# Altium footprint library DevKit - PCB.PcbLib: 30 footprints (part 2 of 2)
Each footprint in its own frame and in the unit in brackets; x right, y up, seen from the top. Pads: shape width x height; smd on the part's side, far side on the other; paste and mask are expansions set on the pad; w line width, h text height; cw(c..) or ccw(c..) is an arc to the next point about the centre after c.
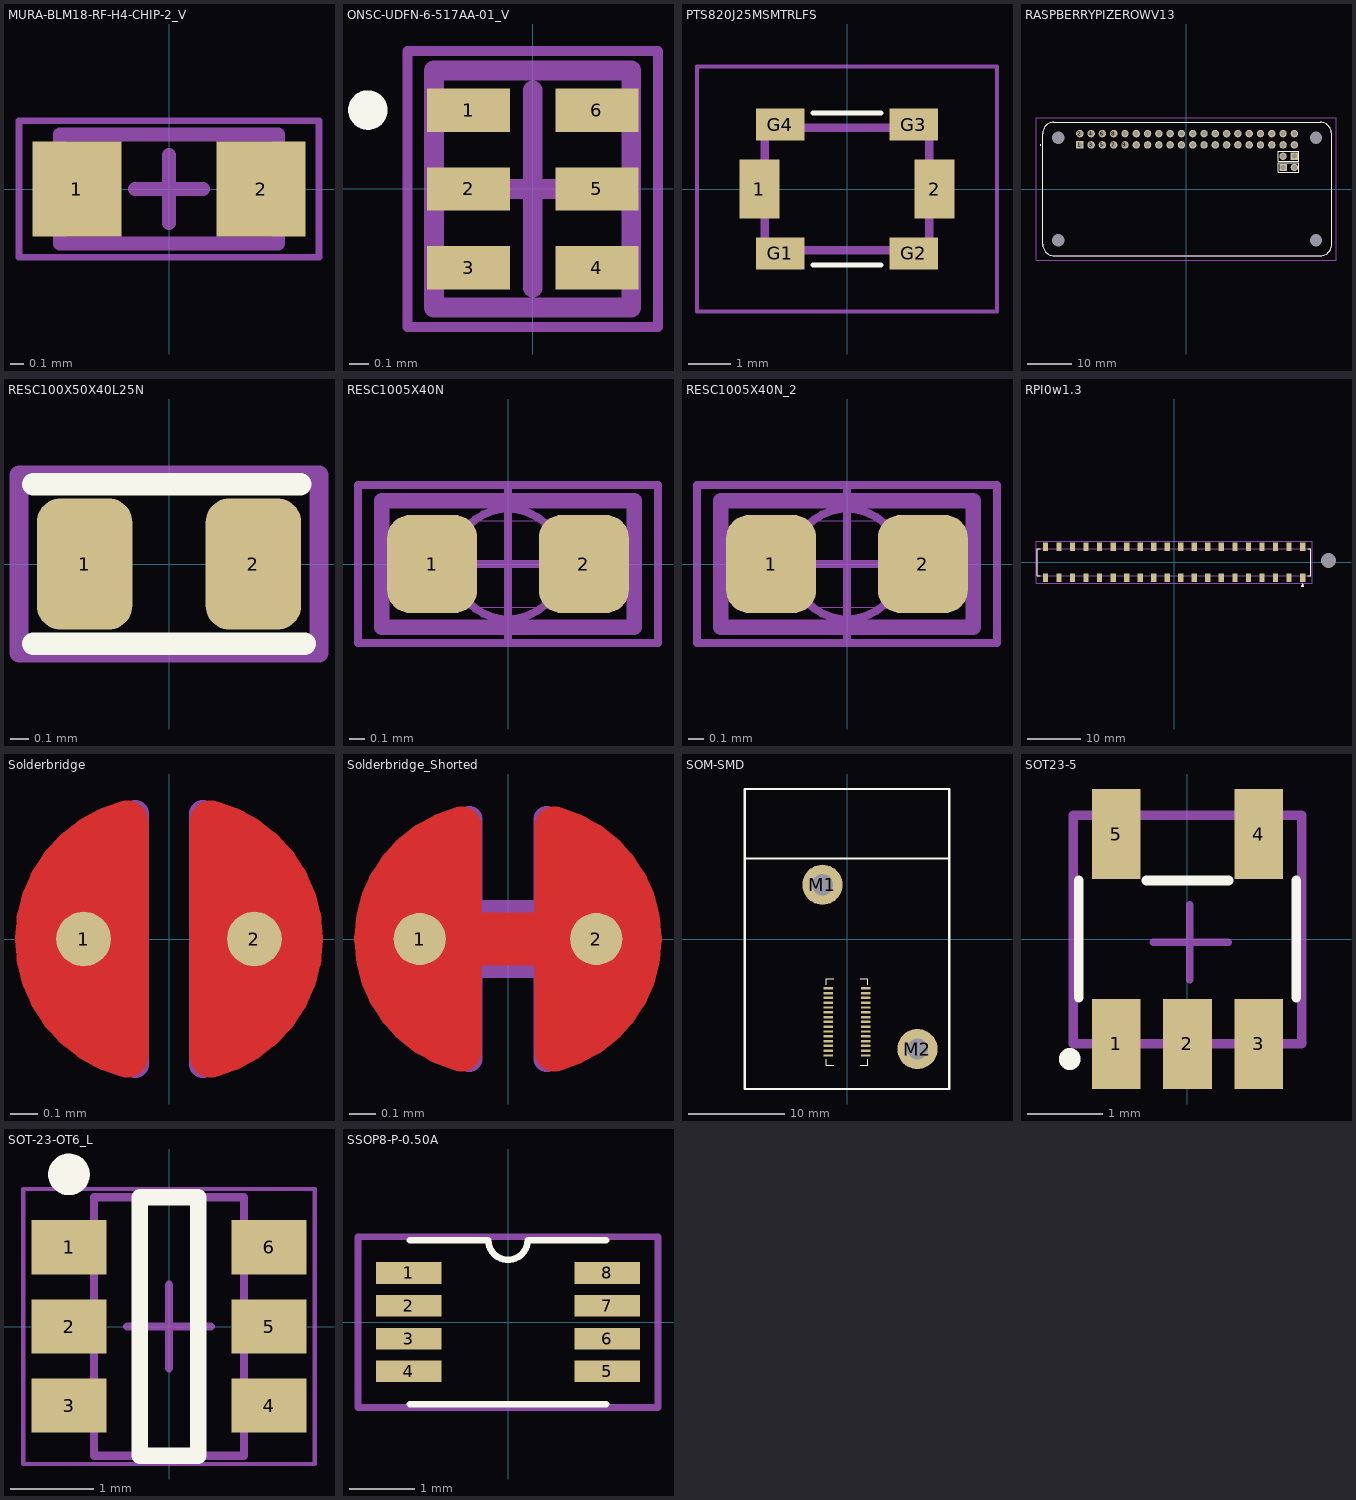
[diagram p1: the footprints below, top view; thin cyan lines are the x and y axes]

## MURA-BLM18-RF-H4-CHIP-2_V [mm]
pads (2):
  rect 0.65x0.7 smd: 1(-0.675,0) 2(0.675,0)
Mechanical 6:
  text "Land Pattern Adapted for Reflow Soldering" at -1,0.6 h0.05
Mechanical 15:
  lines w0.05: -1.1,-0.5 -1.1,0.5 1.1,0.5 1.1,-0.5 -1.1,-0.5
  lines w0.1: -0.25,0 0.25,0 ; 0,-0.25 0,0.25
Mechanical 16:
  lines w0.1: -0.8,-0.4 0.8,-0.4 0.8,0.4 -0.8,0.4 -0.8,-0.4
  text ".Designator" at 0.937,-0.432 h1.5
3D body "BLM18HE152SN1D.STEP": height 0.95, standoff 0, extent -0.8,-0.4 0.8,0.4

## ONSC-UDFN-6-517AA-01_V [mm]
pads (6):
  rect 0.42x0.22 smd mask+0.051: 1(-0.325,0.4) 2(-0.325,0) 3(-0.325,-0.4) 4(0.325,-0.4) 5(0.325,0) 6(0.325,0.4)
Top Overlay:
  circle w0.1: c-0.835,0.4 r0.05
Mechanical 13:
  lines w0.1: -0.5,-0.6 -0.5,0.6 0.5,0.6 0.5,-0.6 -0.5,-0.6
Mechanical 15:
  lines w0.05: -0.635,-0.7 -0.635,0.7 0.635,0.7 0.635,-0.7 -0.635,-0.7
  lines w0.1: -0.5,0 0.5,0 ; 0,-0.5 0,0.5
3D body: height 0.55, standoff 0, extent -0.5,-0.6 0.5,0.6

## PTS820J25MSMTRLFS [mm]
pads (6):
  rect 0.95x1.4 smd: 1(-2.075,0) 2(2.075,0)
  rect 1.15x0.75 smd: G1(-1.575,-1.525) G2(1.575,-1.525) G3(1.575,1.525) G4(-1.575,1.525)
Top Overlay:
  lines w0.127: -0.8,-1.8 0.8,-1.8 ; -0.8,1.8 0.8,1.8
Mechanical 15:
  lines w0.1: -3.55,-2.9 3.55,-2.9 3.55,2.9 -3.55,2.9 -3.55,-2.9
Mechanical 16:
  lines w0.2: -1.95,-1.45 -1.95,1.45 1.95,1.45 1.95,-1.45 -1.95,-1.45
  text ".Designator" at -0.889,-0.399 h1.52
3D body "PUSHBUTTON-PTS820 v3.step": height 2.05, standoff 0.05, extent -2.25,-1.45 2.25,1.45

## RASPBERRYPIZEROWV13 [mm]
pads (48):
  rect 1.665x1.665 hole 1.11: 1(-23.885,9.92) 41(24.375,7.38) 43(21.835,4.84)
  round 1.665 hole 1.11: 2(-23.885,12.46) 3(-21.345,9.92) 4(-21.345,12.46) 5(-18.805,9.92) 6(-18.805,12.46) 7(-16.265,9.92) 8(-16.265,12.46) 9(-13.725,9.92) 10(-13.725,12.46) 11(-11.185,9.92) 12(-11.185,12.46) 13(-8.645,9.92) 14(-8.645,12.46) 15(-6.105,9.92) 16(-6.105,12.46) 17(-3.565,9.92) 18(-3.565,12.46) 19(-1.025,9.92) 20(-1.025,12.46) 21(1.515,9.92) 22(1.515,12.46) 23(4.055,9.92) 24(4.055,12.46) 25(6.595,9.92) 26(6.595,12.46) 27(9.135,9.92) 28(9.135,12.46) 29(11.675,9.92) 30(11.675,12.46) 31(14.215,9.92) 32(14.215,12.46) 33(16.755,9.92) 34(16.755,12.46) 35(19.295,9.92) 36(19.295,12.46) 37(21.835,9.92) 38(21.835,12.46) 39(24.375,9.92) 40(24.375,12.46) 42(21.835,7.38) 44(24.375,4.84)
  round 1.4 hole 2.8 unplated: MH1(-28.755,11.5) MH2(-28.755,-11.5) MH3(29.245,-11.5) MH4(29.245,11.5)
Top Overlay:
  lines w0.1: -32.255,12.46 -32.255,-12.46 ccw(c-29.715,-12.46) -29.759,-15 ; -32.255,12.464 cw(c-29.755,12.499) -29.755,15 30.245,15 ; -29.755,-15 30.245,-15 ccw(c30.245,-12.499) 32.745,-12.464 ; 30.249,15 cw(c30.205,12.46) 32.745,12.46 32.745,-12.46 ; -32.695,9.84 ccw(c-32.695,9.89) -32.695,9.94 ccw(c-32.695,9.89) -32.695,9.84 ; 20.805,3.74 25.405,3.74 25.405,5.94 20.805,5.94 20.805,3.74 ; 20.805,6.28 25.405,6.28 25.405,8.48 20.805,8.48 20.805,6.28
Mechanical 16:
  lines w0.2: -32.255,12.46 -32.255,-12.46 ccw(c-29.715,-12.46) -29.759,-15 ; -32.255,12.464 cw(c-29.755,12.499) -29.755,15 30.245,15 ; -29.755,-15 30.245,-15 ccw(c30.245,-12.499) 32.745,-12.464 ; 30.249,15 cw(c30.245,12.499) 32.745,12.46 32.745,-12.46
  text ".Designator" at -0.636,-0.061 h0.8
Mechanical 20:
  lines w0.1: -33.745,-16 33.745,-16 33.745,16 -33.745,16 -33.745,-16
3D body "Raspberry PI Zero W.step": height 9.98, standoff -1.4, extent -32.246,-15.65 32.754,15

## RESC100X50X40L25N [mm]
pads (2):
  rrect50% 0.51x0.7 smd mask+0.05: 1(-0.45,0) 2(0.45,0)
Top Overlay:
  lines w0.12: -0.725,-0.425 0.725,-0.425 ; -0.725,0.425 0.7,0.425
Mechanical 16:
  lines w0.1: -0.8,-0.475 -0.8,0.475 0.8,0.475 0.8,-0.475 -0.8,-0.475
  text ".Designator" at -1.2,0.2 h0.8
3D body "R0402.STEP": height 0.34, standoff 0, extent -0.52,-0.3 0.52,0.3

## RESC1005X40N [mm]
pads (2):
  rrect50% 0.57x0.62 smd: 1(-0.48,0) 2(0.48,0)
Mechanical 4:
  circle w0.05: c0,0 r0.35
  lines w0.05: -0.5,0 0.5,0 ; 0,-0.5 0,0.5 ; -0.95,-0.5 0.95,-0.5 0.95,0.5 -0.95,0.5 -0.95,-0.5
Mechanical 13:
  lines w0.001: -0.525,-0.275 0.525,-0.275 0.525,0.275 -0.525,0.275 -0.525,-0.275
Mechanical 16:
  lines w0.1: -0.8,-0.4 0.8,-0.4 0.8,0.4 -0.8,0.4 -0.8,-0.4
  text ".Designator" at -1.3,-1.3 h1.5
3D body "RES 0402 (1005 metric).STEP": height 0.4, standoff 0, extent -0.525,-0.275 0.525,0.275

## RESC1005X40N_2 [mm]
pads (2):
  rrect50% 0.57x0.62 smd: 1(-0.48,0) 2(0.48,0)
Mechanical 1:
  lines w0.1: -0.8,-0.4 0.8,-0.4 0.8,0.4 -0.8,0.4 -0.8,-0.4
  text ".Designator" at -1.3,-1.3 h1.5
Mechanical 4:
  circle w0.05: c0,0 r0.35
  lines w0.05: -0.5,0 0.5,0 ; 0,-0.5 0,0.5 ; -0.95,-0.5 0.95,-0.5 0.95,0.5 -0.95,0.5 -0.95,-0.5
Mechanical 13:
  lines w0.001: -0.525,-0.275 0.525,-0.275 0.525,0.275 -0.525,0.275 -0.525,-0.275
3D body "RES 0402 (1005 metric).STEP": height 0.4, standoff 0, extent -0.525,-0.275 0.525,0.275

## RPI0w1.3 [mm]
pads (41):
  rect 1x1.56 smd: 1(24.13,-2.905) 2(24.13,2.905) 3(21.59,-2.905) 4(21.59,2.905) 5(19.05,-2.905) 6(19.05,2.905) 7(16.51,-2.905) 8(16.51,2.905) 9(13.97,-2.905) 10(13.97,2.905) 11(11.43,-2.905) 12(11.43,2.905) 13(8.89,-2.905) 14(8.89,2.905) 15(6.35,-2.905) 16(6.35,2.905) 17(3.81,-2.905) 18(3.81,2.905) 19(1.27,-2.905) 20(1.27,2.905) 21(-1.27,-2.905) 22(-1.27,2.905) 23(-3.81,-2.905) 24(-3.81,2.905) 25(-6.35,-2.905) 26(-6.35,2.905) 27(-8.89,-2.905) 28(-8.89,2.905) 29(-11.43,-2.905) 30(-11.43,2.905) 31(-13.97,-2.905) 32(-13.97,2.905) 33(-16.51,-2.905) 34(-16.51,2.905) 35(-19.05,-2.905) 36(-19.05,2.905) 37(-21.59,-2.905) 38(-21.59,2.905) 39(-24.13,-2.905) 40(-24.13,2.905)
  round 1.4 hole 2.8 unplated: MH1(29,0.31)
Top Overlay:
  region: 24.13,-3.937 23.876,-4.572 24.384,-4.572
  lines w0.127: -25.1,-2.5 -25.65,-2.5 -25.65,2.5 -25.1,2.5 ; 25.1,-2.5 25.65,-2.5 25.65,2.5 25.1,2.5
Mechanical 15:
  lines w0.05: -25.9,-3.935 -25.9,3.935 25.9,3.935 25.9,-3.935 -25.9,-3.935
Mechanical 16:
  region: 24.13,-3.81 23.876,-4.445 24.384,-4.445
  lines w0.127: -25.65,-2.5 25.65,-2.5 25.65,2.5 -25.65,2.5 -25.65,-2.5
3D body "Raspberry PI Zero W.step": height 15.6, standoff 4.22, extent -32.6,-27.15 32.4,3.5
3D body "40 pin connector header smt v3.step": height 10.05, standoff 0, extent -25.7,-2.63 25.7,2.55

## Solderbridge [mm]
pads (2):
  round 0.2 smd paste-10: 1(-0.312,0) 2(0.312,0)
Top Layer:
  region: -0.077,-0.432 -0.152,-0.505 -0.271,-0.467 -0.335,-0.424 -0.409,-0.351 -0.462,-0.292 -0.521,-0.193 -0.549,-0.099 -0.544,0.122 -0.518,0.193 -0.434,0.33 -0.351,0.411 -0.259,0.469 -0.157,0.5 -0.107,0.483 -0.077,0.43
  region: 0.077,0.432 0.152,0.505 0.271,0.467 0.335,0.424 0.409,0.351 0.462,0.292 0.521,0.193 0.549,0.099 0.544,-0.122 0.518,-0.193 0.434,-0.33 0.351,-0.411 0.259,-0.469 0.157,-0.5 0.107,-0.483 0.077,-0.43
  lines w0.152: -0.153,-0.431 cw(c-0.042,0) -0.487,0 cw(c-0.042,0) -0.153,0.431 ; 0.153,-0.431 ccw(c0.042,0) 0.153,0.431
Top Solder:
  circle w0.61: c-0.003,0 r0.279
Mechanical 13:
  lines w0.1: -0.123,-0.459 cw(c-0.042,0) -0.123,0.459 -0.123,-0.459 ; 0.123,-0.459 ccw(c0.042,0) 0.123,0.459 0.123,-0.459
  text ".Designator" at 0.635,-0.152 h0.3

## Solderbridge_Shorted [mm]
pads (2):
  round 0.2 smd paste-10: 1(-0.338,0) 2(0.338,0)
Top Layer:
  region: -0.102,-0.432 -0.178,-0.505 -0.296,-0.467 -0.361,-0.424 -0.434,-0.351 -0.488,-0.292 -0.546,-0.193 -0.574,-0.099 -0.569,0.122 -0.544,0.193 -0.46,0.33 -0.376,0.411 -0.284,0.469 -0.183,0.5 -0.132,0.483 -0.102,0.43
  region: 0.102,0.432 0.178,0.505 0.296,0.467 0.361,0.424 0.434,0.351 0.488,0.292 0.546,0.193 0.574,0.099 0.569,-0.122 0.544,-0.193 0.46,-0.33 0.376,-0.411 0.284,-0.469 0.183,-0.5 0.132,-0.483 0.102,-0.43
  lines w0.152: -0.178,-0.431 cw(c-0.068,0) -0.178,0.431 ; 0.178,-0.431 ccw(c0.068,0) 0.178,0.431
  lines w0.203: -0.338,0 0.338,0
Top Solder:
  circle w0.61: c0.028,0 r0.279
  circle w0.61: c-0.028,0 r0.279
Mechanical 13:
  lines w0.1: -0.148,-0.459 cw(c-0.067,0) -0.148,0.459 -0.148,0.1 0.148,0.1 0.148,0.459 cw(c0.067,0) 0.148,-0.459 0.148,-0.1 -0.148,-0.1 -0.148,-0.459
  text ".Designator" at 0.635,-0.152 h0.3

## SOM-SMD [mm]
pads (32):
  rect 1x0.25 smd mask+0.051: 1(-1.95,-5.15) 2(1.95,-5.15) 3(-1.95,-5.65) 4(1.95,-5.65) 5(-1.95,-6.15) 6(1.95,-6.15) 7(-1.95,-6.65) 8(1.95,-6.65) 9(-1.95,-7.15) 10(1.95,-7.15) 11(-1.95,-7.65) 12(1.95,-7.65) 13(-1.95,-8.15) 14(1.95,-8.15) 15(-1.95,-8.65) 16(1.95,-8.65) 17(-1.95,-9.15) 18(1.95,-9.15) 19(-1.95,-9.65) 20(1.95,-9.65) 21(-1.95,-10.15) 22(1.95,-10.15) 23(-1.95,-10.65) 24(1.95,-10.65) 25(-1.95,-11.15) 26(1.95,-11.15) 27(-1.95,-11.65) 28(1.95,-11.65) 29(-1.95,-12.15) 30(1.95,-12.15)
  round 4.2 hole 2.2: M1(-2.562,5.662) M2(7.344,-11.483)
Top Overlay:
  lines w0.127: -2.15,-12.561 -2.15,-13.155 -1.367,-13.155 ; -2.15,-4.748 -2.15,-4.155 -1.367,-4.155 ; 1.367,-13.155 2.15,-13.155 2.15,-12.561 ; 1.367,-4.155 2.15,-4.155 2.15,-4.748
  lines w0.2: -10.65,8.4 10.65,8.4
  lines w0.254: -10.65,-15.65 -10.65,15.65 10.65,15.65 10.65,-15.65 -10.65,-15.65
Mechanical 16:
  lines w0.2: -10.65,-15.65 -10.65,15.65 10.65,15.65 10.65,-15.65 -10.65,-15.65
  text ".Designator" at -0.158,-8 h0.8
3D body: height 16.5, standoff 7.5, extent -13.444,2.409 -13.444,2.409
3D body "DF23C-30DP-0.5V.stp": height 1.2, standoff 0, extent -2.15,-13.155 2.15,-4.155
3D body "TINYMODULE-V3.step": height 5.19, standoff -0.52, extent -10.65,-15.65 10.65,15.65

## SOT23-5 [mm]
pads (5):
  rect 0.65x1.2 smd: 1(-0.95,-1.4) 2(0,-1.4) 3(0.95,-1.4) 4(0.95,1.4) 5(-0.95,1.4)
Top Overlay:
  circle w0.25: c-1.57,-1.6 r0.02
  lines w0.127: -1.45,-0.78 -1.45,0.78 ; -0.55,0.78 0.55,0.78 ; 1.45,-0.78 1.45,0.78
Mechanical 15:
  lines w0.1: -0.457,-0.045 0.543,-0.045 ; 0.033,-0.545 0.033,0.455
Mechanical 16:
  lines w0.127: -1.524,-1.397 1.524,-1.397 1.524,1.651 -1.524,1.651 -1.524,-1.397
  text ".Designator" at -0.666,-0.253 h0.8
3D body "User Library-SOT-23-5.STEP": height 1.4, standoff -0.06, extent -1.48,-1.41 1.52,1.59

## SOT-23-OT6_L [mm]
pads (6):
  rect 0.9x0.65 smd mask+0.051: 1(-1.2,0.95) 2(-1.2,0) 3(-1.2,-0.95) 4(1.2,-0.95) 5(1.2,0) 6(1.2,0.95)
Top Overlay:
  circle w0.25: c-1.2,1.825 r0.125
  lines w0.2: -0.35,-1.55 -0.35,1.55 0.35,1.55 0.35,-1.55 -0.35,-1.55
Mechanical 15:
  lines w0.05: -1.75,-1.65 1.75,-1.65 1.75,1.65 -1.75,1.65 -1.75,-1.65
  lines w0.1: -0.5,0 0.5,0 ; 0,-0.5 0,0.5
Mechanical 16:
  lines w0.1: -0.9,-1.55 0.9,-1.55 0.9,1.55 -0.9,1.55 -0.9,-1.55
  text ".Designator" at -0.481,-0.313 h0.8
3D body "User Library-SOT-23-6.step": height 1.09, standoff 0, extent -1.213,-1.397 1.213,1.397

## SSOP8-P-0.50A [mm]
pads (8):
  rect 1x0.33 smd mask+0.051: 1(-1.51,0.75) 2(-1.51,0.25) 3(-1.51,-0.25) 4(-1.51,-0.75) 5(1.51,-0.75) 6(1.51,-0.25) 7(1.51,0.25) 8(1.51,0.75)
Top Overlay:
  lines w0.1: -1.5,-1.25 1.5,-1.25 ; -1.5,1.25 -0.3,1.25 ccw(c0,1.25) 0.3,1.25 1.5,1.25
Mechanical 16:
  lines w0.1: -2.286,-1.3 2.286,-1.3 2.286,1.3 -2.286,1.3 -2.286,-1.3
  text ".Designator" at -1.01,-0.415 h0.8
3D body "User Library-VSSOP8-3.STEP": height 0.9, standoff 0, extent -1.55,-1 1.55,1